# Altium footprint library DrPCB.PcbLib: 910 footprints (part 56 of 57)
Each footprint in its own frame and in the unit in brackets; x right, y up, seen from the top. Pads: shape width x height; smd on the part's side, far side on the other; paste and mask are expansions set on the pad; w line width, h text height; cw(c..) or ccw(c..) is an arc to the next point about the centre after c.
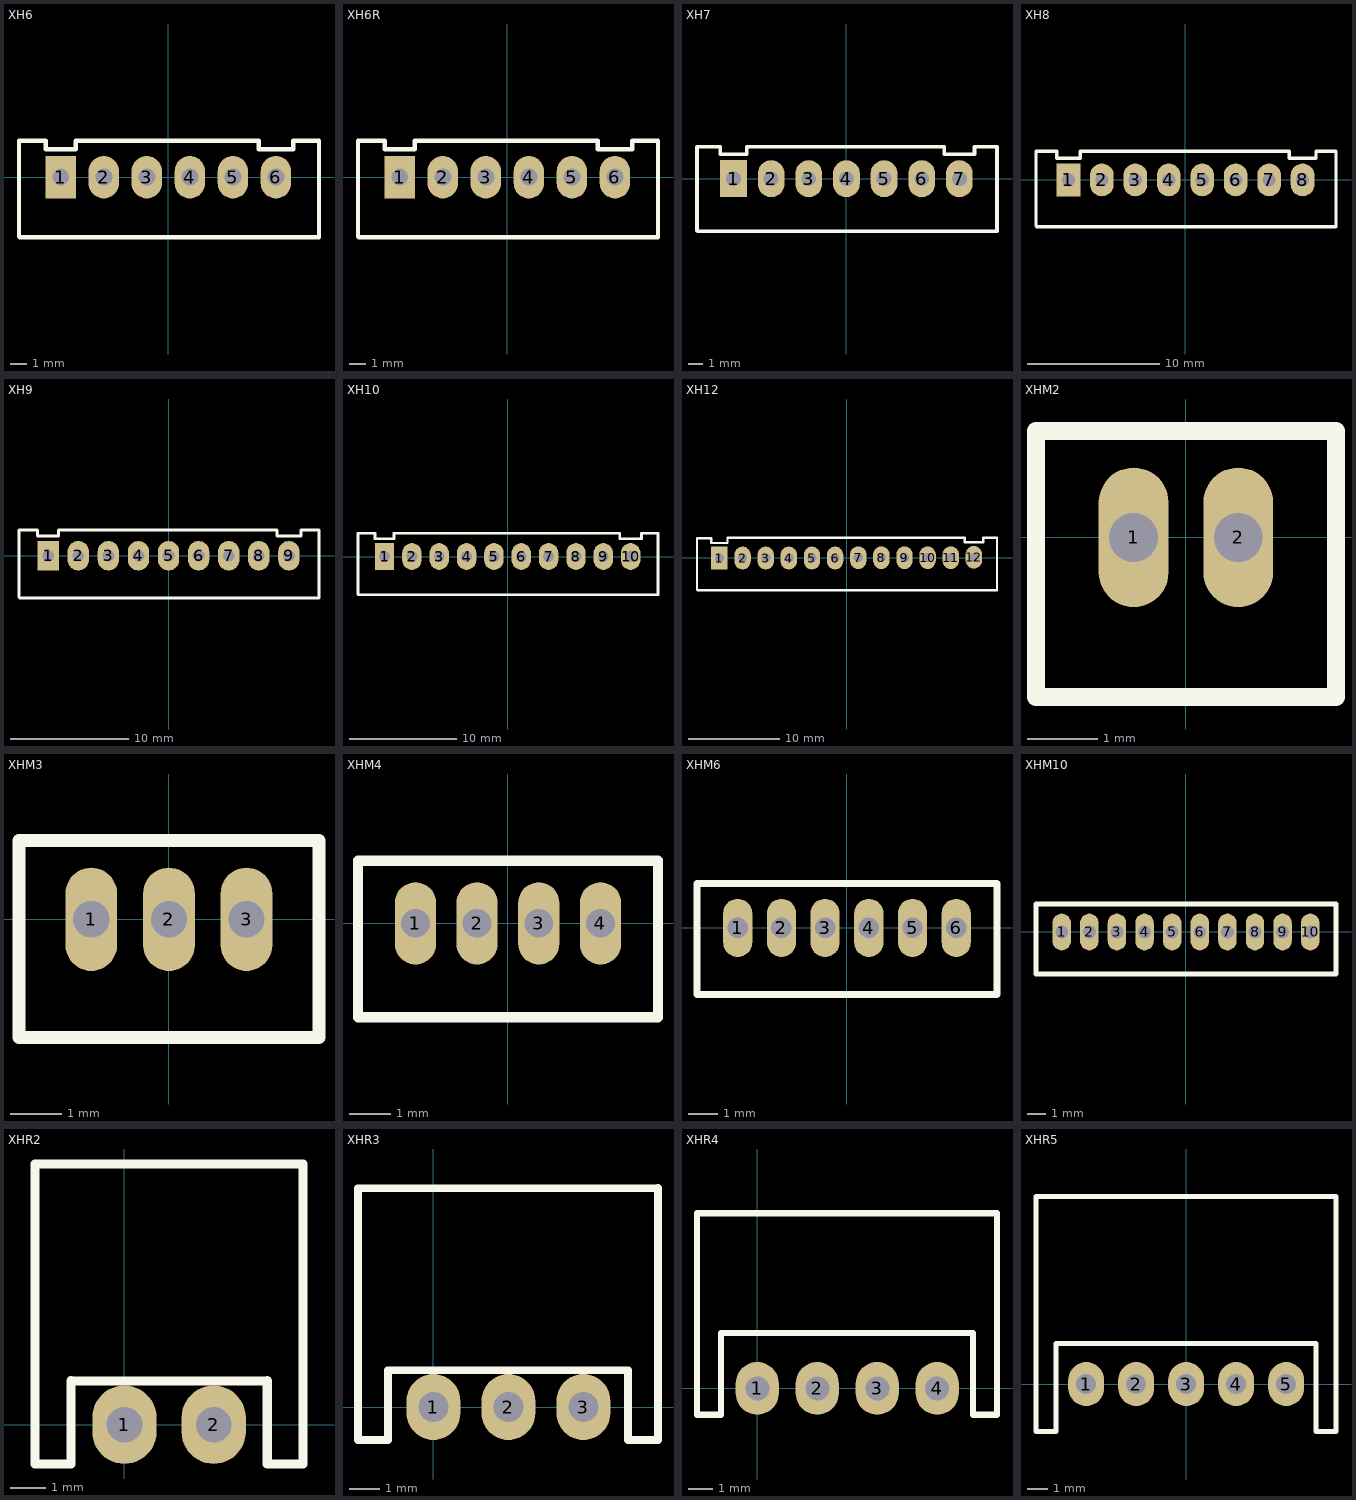
[diagram p55: the footprints below, top view; thin cyan lines are the x and y axes]

## XH6 [mm]
pads (6):
  rect 1.8x2.5 hole 1: 1(-6.35,0)
  oval 1.8x2.5 hole 1: 2(-3.81,0) 3(-1.27,0) 4(1.27,0) 5(3.81,0) 6(6.35,0)
Top Overlay:
  lines w0.254: -8.814,-3.495 -8.814,2.159 -7.239,2.159 -7.239,1.651 -5.461,1.651 -5.461,2.159 ; -8.763,-3.551 8.877,-3.551 ; -5.448,2.159 5.334,2.159 5.334,1.651 7.366,1.651 7.366,2.159 8.89,2.159 8.89,-3.551

## XH6R [mm]
pads (6):
  rect 1.8x2.5 hole 1: 1(-6.35,0)
  oval 1.8x2.5 hole 1: 2(-3.81,0) 3(-1.27,0) 4(1.27,0) 5(3.81,0) 6(6.35,0)
Top Overlay:
  lines w0.254: -8.814,-3.495 -8.814,2.159 -7.239,2.159 -7.239,1.651 -5.461,1.651 -5.461,2.159 ; -8.763,-3.551 8.877,-3.551 ; -5.448,2.159 5.334,2.159 5.334,1.651 7.366,1.651 7.366,2.159 8.89,2.159 8.89,-3.551
3D body "User Library-S XH-A.step": height 6.1, standoff -2, extent -8.637,-9.271 8.764,2.229

## XH7 [mm]
pads (7):
  rect 1.8x2.5 hole 1: 1(-7.62,0)
  oval 1.8x2.5 hole 1: 2(-5.08,0) 3(-2.54,0) 4(0,0) 5(2.54,0) 6(5.08,0) 7(7.62,0)
Top Overlay:
  lines w0.254: -10.084,-3.495 -10.084,2.159 -8.509,2.159 -8.509,1.651 -6.731,1.651 -6.731,2.159 6.604,2.159 6.604,1.651 8.636,1.651 8.636,2.159 10.16,2.159 10.16,-3.551 -10.033,-3.551
3D body "User Library-B7B-XH-A.step": height 7, standoff -3.4, extent -9.95,-3.4 9.95,2.35

## XH8 [mm]
pads (8):
  rect 1.8x2.5 hole 1: 1(-8.89,0)
  oval 1.8x2.5 hole 1: 2(-6.35,0) 3(-3.81,0) 4(-1.27,0) 5(1.27,0) 6(3.81,0) 7(6.35,0) 8(8.89,0)
Top Overlay:
  lines w0.254: -11.354,-3.495 -11.354,2.159 -9.779,2.159 -9.779,1.651 -8.001,1.651 -8.001,2.159 ; -11.303,-3.551 11.379,-3.551 ; -7.988,2.159 7.874,2.159 7.874,1.651 9.906,1.651 9.906,2.159 11.43,2.159 11.43,-3.551

## XH9 [mm]
pads (9):
  rect 1.8x2.5 hole 1: 1(-10.16,0)
  oval 1.8x2.5 hole 1: 2(-7.62,0) 3(-5.08,0) 4(-2.54,0) 5(0,0) 6(2.54,0) 7(5.08,0) 8(7.62,0) 9(10.16,0)
Top Overlay:
  lines w0.254: -12.624,-3.495 -12.624,2.159 -11.049,2.159 -11.049,1.651 -9.271,1.651 -9.271,2.159 ; -12.573,-3.551 12.662,-3.551 ; -9.258,2.159 9.106,2.159 ; 9.144,2.159 9.144,1.651 11.176,1.651 11.176,2.159 12.7,2.159 12.7,-3.551
3D body "xh4.step": height 7.01, standoff -3.39, extent -12.45,-3.375 12.45,2.375

## XH10 [mm]
pads (10):
  rect 1.8x2.5 hole 1: 1(-11.43,0)
  oval 1.8x2.5 hole 1: 2(-8.89,0) 3(-6.35,0) 4(-3.81,0) 5(-1.27,0) 6(1.27,0) 7(3.81,0) 8(6.35,0) 9(8.89,0) 10(11.43,0)
Top Overlay:
  lines w0.254: -13.894,-3.495 -13.894,2.159 -12.319,2.159 -12.319,1.651 -10.541,1.651 -10.541,2.159 ; -13.843,-3.551 13.957,-3.551 ; -10.528,2.159 10.401,2.159 10.414,2.146 ; 10.414,2.159 10.414,1.651 12.446,1.651 12.446,2.159 13.97,2.159 13.97,-3.551
3D body "JST - XH - Thru V - 10Pin - 2.54mm.stp": height 7.21, standoff -3, extent -13.71,-3.617 13.824,2.225

## XH12 [mm]
pads (12):
  rect 1.8x2.5 hole 1: 1(-13.97,-0.038)
  oval 1.8x2.5 hole 1: 2(-11.43,-0.038) 3(-8.89,-0.038) 4(-6.35,-0.038) 5(-3.81,-0.038) 6(-1.27,-0.038) 7(1.27,0) 8(3.81,0) 9(6.35,0) 10(8.89,0) 11(11.43,0) 12(13.97,0.038)
Top Overlay:
  lines w0.254: -16.434,-3.533 -16.434,2.121 -14.859,2.121 -14.859,1.613 -13.081,1.613 -13.081,2.197 12.954,2.197 12.954,1.689 14.986,1.689 14.986,2.197 16.51,2.197 16.51,-3.589 -16.383,-3.589

## XHM2 [mm]
pads (2):
  oval 1x2 hole 0.7: 1(-0.75,0) 2(0.75,0)
Top Overlay:
  lines w0.254: -2.147,-2.286 2.15,-2.286 2.15,1.524 -2.147,1.524 -2.147,-2.286

## XHM3 [mm]
pads (3):
  oval 1x2 hole 0.7: 1(-1.5,0) 2(0,0) 3(1.5,0)
Top Overlay:
  lines w0.254: -2.897,-2.286 -2.897,1.524 2.9,1.524 2.9,-2.286 -2.897,-2.286

## XHM4 [mm]
pads (4):
  oval 1x2 hole 0.7: 1(-2.25,0) 2(-0.75,0) 3(0.75,0) 4(2.25,0)
Top Overlay:
  lines w0.254: -3.647,-2.286 -3.647,1.524 3.65,1.524 3.65,-2.286 -3.647,-2.286

## XHM6 [mm]
pads (6):
  oval 1x2 hole 0.7: 1(-3.75,0) 2(-2.25,0) 3(-0.75,0) 4(0.75,0) 5(2.25,0) 6(3.75,0)
Top Overlay:
  lines w0.254: -5.147,-2.286 5.15,-2.286 5.15,1.524 -5.147,1.524 -5.147,-2.286

## XHM10 [mm]
pads (10):
  oval 1x2 hole 0.7: 1(-6.75,0) 2(-5.25,0) 3(-3.75,0) 4(-2.25,0) 5(-0.75,0) 6(0.75,0) 7(2.25,0) 8(3.75,0) 9(5.25,0) 10(6.75,0)
Top Overlay:
  lines w0.254: -8.147,-2.286 8.15,-2.286 8.15,1.524 -8.147,1.524 -8.147,-2.286

## XHR2 [mm]
pads (2):
  oval 1.8x2.2 hole 1: 1(0,0) 2(2.5,0)
Top Overlay:
  lines w0.254: -2.502,7.3 5,7.3 ; -2.5,-1.1 -1.5,-1.1 ; -2.5,-1.092 -2.5,7.29 ; -1.5,-1.092 -1.5,1.232 ; -1.5,1.227 4,1.227 ; 4,1.232 4,-1.1 5,-1.1 5,7.302
3D body "User Library-S2B-XH.STEP": height 6.1, standoff -3.4, extent -2.455,-2.242 4.945,9.258

## XHR3 [mm]
pads (3):
  oval 1.8x2.2 hole 1: 1(0,0) 2(2.5,0) 3(5,0)
Top Overlay:
  lines w0.254: -2.515,7.3 7.48,7.3 ; -2.513,-1.1 -1.513,-1.1 ; -2.513,-1.092 -2.513,7.29 ; -1.513,-1.092 -1.513,1.219 ; -1.511,1.227 6.49,1.227 ; 6.489,-1.1 7.489,-1.1 ; 6.489,-1.092 6.489,1.219 ; 7.489,-1.079 7.489,7.302

## XHR4 [mm]
pads (4):
  oval 1.8x2.2 hole 1: 1(0,0) 2(2.5,0) 3(5,0) 4(7.5,0)
Top Overlay:
  lines w0.254: -2.515,7.3 9.97,7.3 ; -2.513,7.3 -2.513,-1.1 -1.513,-1.1 -1.513,2.3 ; -1.511,2.3 8.979,2.3 ; 8.991,2.3 8.991,-1.1 9.991,-1.1 9.991,7.3

## XHR5 [mm]
pads (5):
  oval 1.8x2.2 hole 1: 1(-5,0) 2(-2.5,0) 3(0,0) 4(2.5,0) 5(5,0)
Top Overlay:
  lines w0.254: 6.457,2.032 -6.513,2.032 -6.513,-2.362 -7.513,-2.362 -7.513,9.373 7.46,9.373 ; 6.491,2.032 6.491,-2.362 7.491,-2.362 7.491,9.373
3D body "User Library-jst-s5b-xh-a.step": height 6.11, standoff -3.39, extent -7.45,-2.343 7.45,9.157